# Altium footprint library WR-TBL_Pluggable PCB Header.PcbLib: 719 footprints (part 30 of 45)
Each footprint in its own frame and in the unit in brackets; x right, y up, seen from the top. Pads: shape width x height; smd on the part's side, far side on the other; paste and mask are expansions set on the pad; w line width, h text height; cw(c..) or ccw(c..) is an arc to the next point about the centre after c.
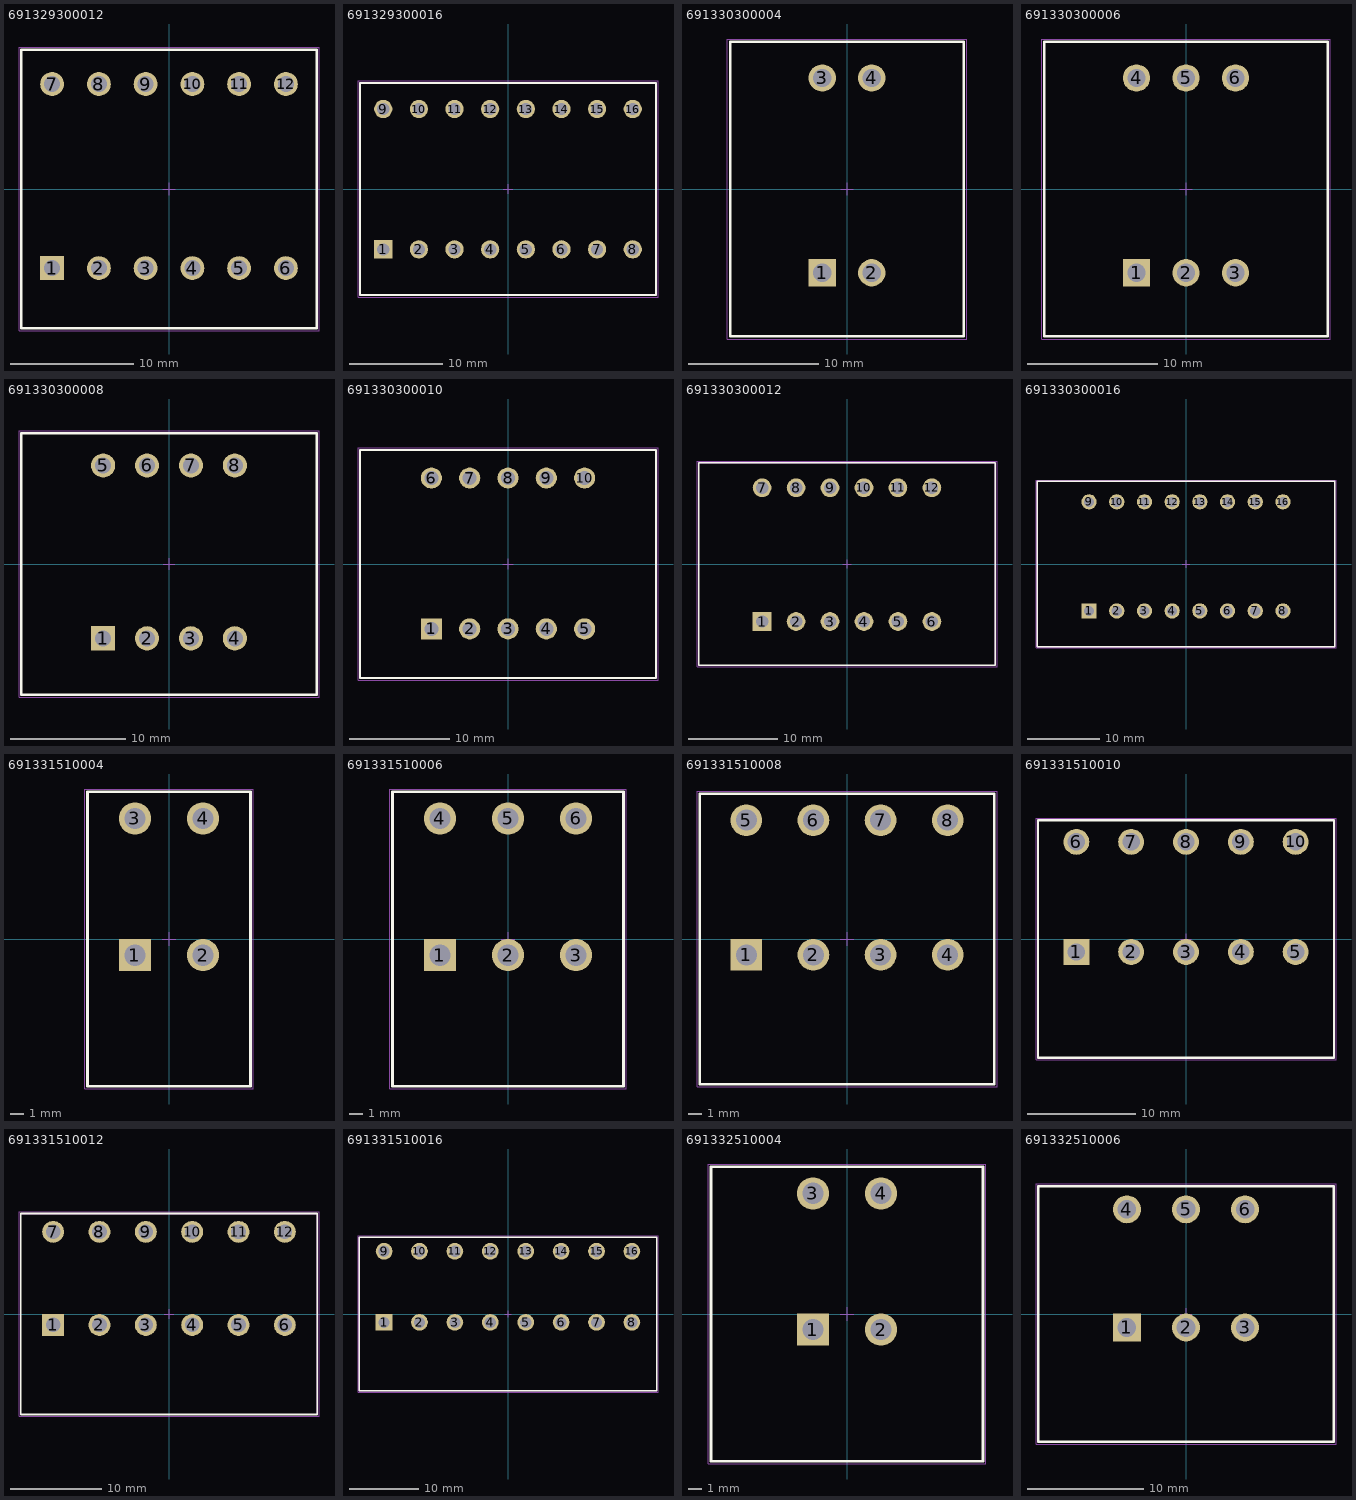
[diagram p29: the footprints below, top view; thin cyan lines are the x and y axes]

## 691329300012 [mm] "Double Level Vertical Male PCB Header, pitch 3.81mm, 12p"
height 22
pads (12):
  rect 1.95x1.95 hole 1.3: 1(-9.525,-6.45)
  round 1.95 hole 1.3: 2(-5.715,-6.45) 3(-1.905,-6.45) 4(1.905,-6.45) 5(5.715,-6.45) 6(9.525,-6.45) 7(-9.525,8.55) 8(-5.715,8.55) 9(-1.905,8.55) 10(1.905,8.55) 11(5.715,8.55) 12(9.525,8.55)
Top Overlay:
  lines w0.2: -12.025,-11.35 -12.025,11.35 12.025,11.35 12.025,-11.35 -12.025,-11.35
Mechanical 13:
  lines w0.1: -12.025,-11.35 12.025,-11.35 12.025,11.35 -12.025,11.35 -12.025,-11.35
Mechanical 15:
  lines w0.05: -0.5,0 0.5,0 ; 0,-0.5 0,0.5 ; -12.225,-11.55 -12.225,11.55 12.225,11.55 12.225,-11.55 -12.225,-11.55
3D body "691329300012.stp": height 22.1, standoff -3.4, extent -12.025,-11.35 12.025,11.35

## 691329300016 [mm] "Double Level Vertical Male PCB Header, pitch 3.81mm, 16p"
height 22
pads (16):
  rect 1.95x1.95 hole 1.3: 1(-13.335,-6.45)
  round 1.95 hole 1.3: 2(-9.525,-6.45) 3(-5.715,-6.45) 4(-1.905,-6.45) 5(1.905,-6.45) 6(5.715,-6.45) 7(9.525,-6.45) 8(13.335,-6.45) 9(-13.335,8.55) 10(-9.525,8.55) 11(-5.715,8.55) 12(-1.905,8.55) 13(1.905,8.55) 14(5.715,8.55) 15(9.525,8.55) 16(13.335,8.55)
Top Overlay:
  lines w0.2: -15.835,-11.35 15.835,-11.35 15.835,11.35 -15.835,11.35 -15.835,-11.35
Mechanical 13:
  lines w0.1: -15.835,-11.35 -15.835,11.35 15.835,11.35 15.835,-11.35 -15.835,-11.35
Mechanical 15:
  lines w0.05: -0.5,0 0.5,0 ; 0,-0.5 0,0.5 ; -16.035,-11.55 16.035,-11.55 16.035,11.55 -16.035,11.55 -16.035,-11.55
3D body "691329300016.stp": height 22.1, standoff -3.4, extent -15.835,-11.35 15.835,11.35

## 691330300004 [mm] "Double Level Vertical Male PCB Header with Flanges & Nut Type, pitch 3.81mm, 04p"
height 22
pads (4):
  rect 2.1x2.1 hole 1.4: 1(-1.905,-6.45)
  round 2.1 hole 1.4: 2(1.905,-6.45) 3(-1.905,8.55) 4(1.905,8.55)
Top Overlay:
  lines w0.2: -9.005,-11.35 9.005,-11.35 9.005,11.35 -9.005,11.35 -9.005,-11.35
Mechanical 13:
  lines w0.1: -9.005,-11.35 -9.005,11.35 9.005,11.35 9.005,-11.35 -9.005,-11.35
Mechanical 15:
  lines w0.05: -0.5,0 0.5,0 ; 0,-0.5 0,0.5 ; -9.205,-11.55 9.205,-11.55 9.205,11.55 -9.205,11.55 -9.205,-11.55
3D body "691330300004.stp": height 22.1, standoff -3.4, extent -9.005,-11.35 9.005,11.35

## 691330300006 [mm] "Double Level Vertical Male PCB Header with Flanges & Nut Type, pitch 3.81mm, 06p"
height 22
pads (6):
  rect 2.1x2.1 hole 1.4: 1(-3.81,-6.45)
  round 2.1 hole 1.4: 2(0,-6.45) 3(3.81,-6.45) 4(-3.81,8.55) 5(0,8.55) 6(3.81,8.55)
Top Overlay:
  lines w0.2: -10.91,-11.35 -10.91,11.35 10.91,11.35 10.91,-11.35 -10.91,-11.35
Mechanical 13:
  lines w0.1: -10.91,-11.35 10.91,-11.35 10.91,11.35 -10.91,11.35 -10.91,-11.35
Mechanical 15:
  lines w0.05: -0.5,0 0.5,0 ; 0,-0.5 0,0.5 ; -11.11,-11.55 -11.11,11.55 11.11,11.55 11.11,-11.55 -11.11,-11.55
3D body "691330300006.stp": height 22.1, standoff -3.4, extent -10.91,-11.35 10.91,11.35

## 691330300008 [mm] "Double Level Vertical Male PCB Header with Flanges & Nut Type, pitch 3.81mm, 08p"
height 22
pads (8):
  rect 2.1x2.1 hole 1.4: 1(-5.715,-6.45)
  round 2.1 hole 1.4: 2(-1.905,-6.45) 3(1.905,-6.45) 4(5.715,-6.45) 5(-5.715,8.55) 6(-1.905,8.55) 7(1.905,8.55) 8(5.715,8.55)
Top Overlay:
  lines w0.2: -12.815,-11.35 12.815,-11.35 12.815,11.35 -12.815,11.35 -12.815,-11.35
Mechanical 13:
  lines w0.1: -12.815,-11.35 -12.815,11.35 12.815,11.35 12.815,-11.35 -12.815,-11.35
Mechanical 15:
  lines w0.05: -0.5,0 0.5,0 ; 0,-0.5 0,0.5 ; -13.015,-11.55 13.015,-11.55 13.015,11.55 -13.015,11.55 -13.015,-11.55
3D body "691330300008.stp": height 22.1, standoff -3.4, extent -12.815,-11.35 12.815,11.35

## 691330300010 [mm] "Double Level Vertical Male PCB Header with Flanges & Nut Type, pitch 3.81mm, 10p"
height 22
pads (10):
  rect 2.1x2.1 hole 1.4: 1(-7.62,-6.45)
  round 2.1 hole 1.4: 2(-3.81,-6.45) 3(0,-6.45) 4(3.81,-6.45) 5(7.62,-6.45) 6(-7.62,8.55) 7(-3.81,8.55) 8(0,8.55) 9(3.81,8.55) 10(7.62,8.55)
Top Overlay:
  lines w0.2: -14.72,-11.35 14.72,-11.35 14.72,11.35 -14.72,11.35 -14.72,-11.35
Mechanical 13:
  lines w0.1: -14.72,-11.35 -14.72,11.35 14.72,11.35 14.72,-11.35 -14.72,-11.35
Mechanical 15:
  lines w0.05: -0.5,0 0.5,0 ; 0,-0.5 0,0.5 ; -14.92,-11.55 14.92,-11.55 14.92,11.55 -14.92,11.55 -14.92,-11.55
3D body "691330300010.stp": height 22.1, standoff -3.4, extent -14.72,-11.35 14.72,11.35

## 691330300012 [mm] "Double Level Vertical Male PCB Header with Flanges & Nut Type, pitch 3.81mm, 12p"
height 22
pads (12):
  rect 2.1x2.1 hole 1.4: 1(-9.525,-6.45)
  round 2.1 hole 1.4: 2(-5.715,-6.45) 3(-1.905,-6.45) 4(1.905,-6.45) 5(5.715,-6.45) 6(9.525,-6.45) 7(-9.525,8.55) 8(-5.715,8.55) 9(-1.905,8.55) 10(1.905,8.55) 11(5.715,8.55) 12(9.525,8.55)
Top Overlay:
  lines w0.2: -16.625,-11.35 -16.625,11.35 16.625,11.35 16.625,-11.35 -16.625,-11.35
Mechanical 13:
  lines w0.1: -16.625,-11.35 16.625,-11.35 16.625,11.35 -16.625,11.35 -16.625,-11.35
Mechanical 15:
  lines w0.05: -0.5,0 0.5,0 ; 0,-0.5 0,0.5 ; -16.825,-11.55 -16.825,11.55 16.825,11.55 16.825,-11.55 -16.825,-11.55
3D body "691330300012.stp": height 22.1, standoff -3.4, extent -16.625,-11.35 16.625,11.35

## 691330300016 [mm] "Double Level Vertical Male PCB Header with Flanges & Nut Type, pitch 3.81mm, 16p"
height 22
pads (16):
  rect 2.1x2.1 hole 1.4: 1(-13.335,-6.45)
  round 2.1 hole 1.4: 2(-9.525,-6.45) 3(-5.715,-6.45) 4(-1.905,-6.45) 5(1.905,-6.45) 6(5.715,-6.45) 7(9.525,-6.45) 8(13.335,-6.45) 9(-13.335,8.55) 10(-9.525,8.55) 11(-5.715,8.55) 12(-1.905,8.55) 13(1.905,8.55) 14(5.715,8.55) 15(9.525,8.55) 16(13.335,8.55)
Top Overlay:
  lines w0.2: -20.435,-11.35 20.435,-11.35 20.435,11.35 -20.435,11.35 -20.435,-11.35
Mechanical 13:
  lines w0.1: -20.435,-11.35 -20.435,11.35 20.435,11.35 20.435,-11.35 -20.435,-11.35
Mechanical 15:
  lines w0.05: -0.5,0 0.5,0 ; 0,-0.5 0,0.5 ; -20.635,-11.55 20.635,-11.55 20.635,11.55 -20.635,11.55 -20.635,-11.55
3D body "691330300016.stp": height 22.1, standoff -3.4, extent -20.435,-11.35 20.435,11.35

## 691331510004 [mm] "5,08mm - PCB - Dual row - Horizontal - 04p"
height 28.8
pads (4):
  rect 2.4x2.4 hole 1.6: 1(-2.54,-1.2)
  round 2.4 hole 1.6: 2(2.54,-1.2) 3(-2.54,9) 4(2.54,9)
Top Overlay:
  lines w0.2: -6.08,-11 6.08,-11 6.08,11 -6.08,11 -6.08,-11
Mechanical 13:
  lines w0.1: -6.08,-11 -6.08,11 6.08,11 6.08,-11 -6.08,-11
Mechanical 15:
  lines w0.05: -0.5,0 0.5,0 ; 0,-0.5 0,0.5 ; -6.28,-11.2 -6.28,11.2 6.28,11.2 6.28,-11.2 -6.28,-11.2
3D body "691331510004.stp": height 28.85, standoff -3.95, extent -6.08,-11 6.08,11

## 691331510006 [mm] "5,08mm - PCB - Dual row - Horizontal - 06p"
height 28.8
pads (6):
  rect 2.4x2.4 hole 1.6: 1(-5.08,-1.2)
  round 2.4 hole 1.6: 2(0,-1.2) 3(5.08,-1.2) 4(-5.08,9) 5(0,9) 6(5.08,9)
Top Overlay:
  lines w0.2: -8.62,-11 -8.62,11 8.62,11 8.62,-11 -8.62,-11
Mechanical 13:
  lines w0.1: -8.62,-11 8.62,-11 8.62,11 -8.62,11 -8.62,-11
Mechanical 15:
  lines w0.05: -0.5,0 0.5,0 ; 0,-0.5 0,0.5 ; -8.82,-11.2 8.82,-11.2 8.82,11.2 -8.82,11.2 -8.82,-11.2
3D body "691331510006.stp": height 28.85, standoff -3.95, extent -8.62,-11 8.62,11

## 691331510008 [mm] "5,08mm - PCB - Dual row - Horizontal - 08p"
height 28.8
pads (8):
  rect 2.4x2.4 hole 1.6: 1(-7.62,-1.2)
  round 2.4 hole 1.6: 2(-2.54,-1.2) 3(2.54,-1.2) 4(7.62,-1.2) 5(-7.62,9) 6(-2.54,9) 7(2.54,9) 8(7.62,9)
Top Overlay:
  lines w0.2: -11.16,-11 11.16,-11 11.16,11 -11.16,11 -11.16,-11
Mechanical 13:
  lines w0.1: -11.16,-11 -11.16,11 11.16,11 11.16,-11 -11.16,-11
Mechanical 15:
  lines w0.05: -0.5,0 0.5,0 ; 0,-0.5 0,0.5 ; -11.36,-11.2 -11.36,11.2 11.36,11.2 11.36,-11.2 -11.36,-11.2
3D body "691331510008.stp": height 28.85, standoff -3.95, extent -11.16,-11 11.16,11

## 691331510010 [mm] "5,08mm - PCB - Dual row - Horizontal - 10p"
height 28.8
pads (10):
  rect 2.4x2.4 hole 1.6: 1(-10.16,-1.2)
  round 2.4 hole 1.6: 2(-5.08,-1.2) 3(0,-1.2) 4(5.08,-1.2) 5(10.16,-1.2) 6(-10.16,9) 7(-5.08,9) 8(0,9) 9(5.08,9) 10(10.16,9)
Top Overlay:
  lines w0.2: -13.7,-11 13.7,-11 13.7,11 -13.7,11 -13.7,-11
Mechanical 13:
  lines w0.1: -13.7,-11 -13.7,11 13.7,11 13.7,-11 -13.7,-11
Mechanical 15:
  lines w0.05: -0.5,0 0.5,0 ; 0,-0.5 0,0.5 ; -13.9,-11.2 -13.9,11.2 13.9,11.2 13.9,-11.2 -13.9,-11.2
3D body "691331510010.stp": height 28.85, standoff -3.95, extent -13.7,-11 13.7,11

## 691331510012 [mm] "5,08mm - PCB - Dual row - Horizontal - 12p"
height 28.8
pads (12):
  rect 2.4x2.4 hole 1.6: 1(-12.7,-1.2)
  round 2.4 hole 1.6: 2(-7.62,-1.2) 3(-2.54,-1.2) 4(2.54,-1.2) 5(7.62,-1.2) 6(12.7,-1.2) 7(-12.7,9) 8(-7.62,9) 9(-2.54,9) 10(2.54,9) 11(7.62,9) 12(12.7,9)
Top Overlay:
  lines w0.2: -16.24,-11 16.24,-11 16.24,11 -16.24,11 -16.24,-11
Mechanical 13:
  lines w0.1: -16.24,-11 -16.24,11 16.24,11 16.24,-11 -16.24,-11
Mechanical 15:
  lines w0.05: -0.5,0 0.5,0 ; 0,-0.5 0,0.5 ; -16.44,-11.2 -16.44,11.2 16.44,11.2 16.44,-11.2 -16.44,-11.2
3D body "691331510012.stp": height 28.85, standoff -3.95, extent -16.24,-11 16.24,11

## 691331510016 [mm] "5,08mm - PCB - Dual row - Horizontal - 16p"
height 28.8
pads (16):
  rect 2.4x2.4 hole 1.6: 1(-17.78,-1.2)
  round 2.4 hole 1.6: 2(-12.7,-1.2) 3(-7.62,-1.2) 4(-2.54,-1.2) 5(2.54,-1.2) 6(7.62,-1.2) 7(12.7,-1.2) 8(17.78,-1.2) 9(-17.78,9) 10(-12.7,9) 11(-7.62,9) 12(-2.54,9) 13(2.54,9) 14(7.62,9) 15(12.7,9) 16(17.78,9)
Top Overlay:
  lines w0.2: -21.32,-11 -21.32,11 21.32,11 21.32,-11 -21.32,-11
Mechanical 13:
  lines w0.1: -21.32,-11 21.32,-11 21.32,11 -21.32,11 -21.32,-11
Mechanical 15:
  lines w0.05: -0.5,0 0.5,0 ; 0,-0.5 0,0.5 ; -21.52,-11.2 21.52,-11.2 21.52,11.2 -21.52,11.2 -21.52,-11.2
3D body "691331510016.stp": height 28.85, standoff -3.95, extent -21.32,-11 21.32,11

## 691332510004 [mm] "5,08mm - PCB - Dual row - Horizontal - Flanges - 04p"
height 28.8
pads (4):
  rect 2.4x2.4 hole 1.6: 1(-2.54,-1.16)
  round 2.4 hole 1.6: 2(2.54,-1.16) 3(-2.54,9) 4(2.54,9)
Top Overlay:
  lines w0.2: -10.16,-11 10.16,-11 10.16,11 -10.16,11 -10.16,-11
Mechanical 13:
  lines w0.1: -10.16,-11 -10.16,11 10.16,11 10.16,-11 -10.16,-11
Mechanical 15:
  lines w0.05: -0.5,0 0.5,0 ; 0,-0.5 0,0.5 ; -10.36,-11.2 10.36,-11.2 10.36,11.2 -10.36,11.2 -10.36,-11.2
3D body "691332510004.stp": height 28.85, standoff -3.95, extent -10.16,-11 10.16,11

## 691332510006 [mm] "5,08mm - PCB - Dual row - Horizontal - Flanges - 06p"
height 28.8
pads (6):
  rect 2.4x2.4 hole 1.6: 1(-5.08,-1.16)
  round 2.4 hole 1.6: 2(0,-1.16) 3(5.08,-1.16) 4(-5.08,9) 5(0,9) 6(5.08,9)
Top Overlay:
  lines w0.2: -12.7,-11 -12.7,11 12.7,11 12.7,-11 -12.7,-11
Mechanical 13:
  lines w0.1: -12.7,-11 12.7,-11 12.7,11 -12.7,11 -12.7,-11
Mechanical 15:
  lines w0.05: -0.5,0 0.5,0 ; 0,-0.5 0,0.5 ; -12.9,-11.2 -12.9,11.2 12.9,11.2 12.9,-11.2 -12.9,-11.2
3D body "691332510006.stp": height 28.85, standoff -3.95, extent -12.7,-11 12.7,11